# Altium footprint library Mylib.PcbLib: 294 footprints (part 3 of 19)
Each footprint in its own frame and in the unit in brackets; x right, y up, seen from the top. Pads: shape width x height; smd on the part's side, far side on the other; paste and mask are expansions set on the pad; w line width, h text height; cw(c..) or ccw(c..) is an arc to the next point about the centre after c.
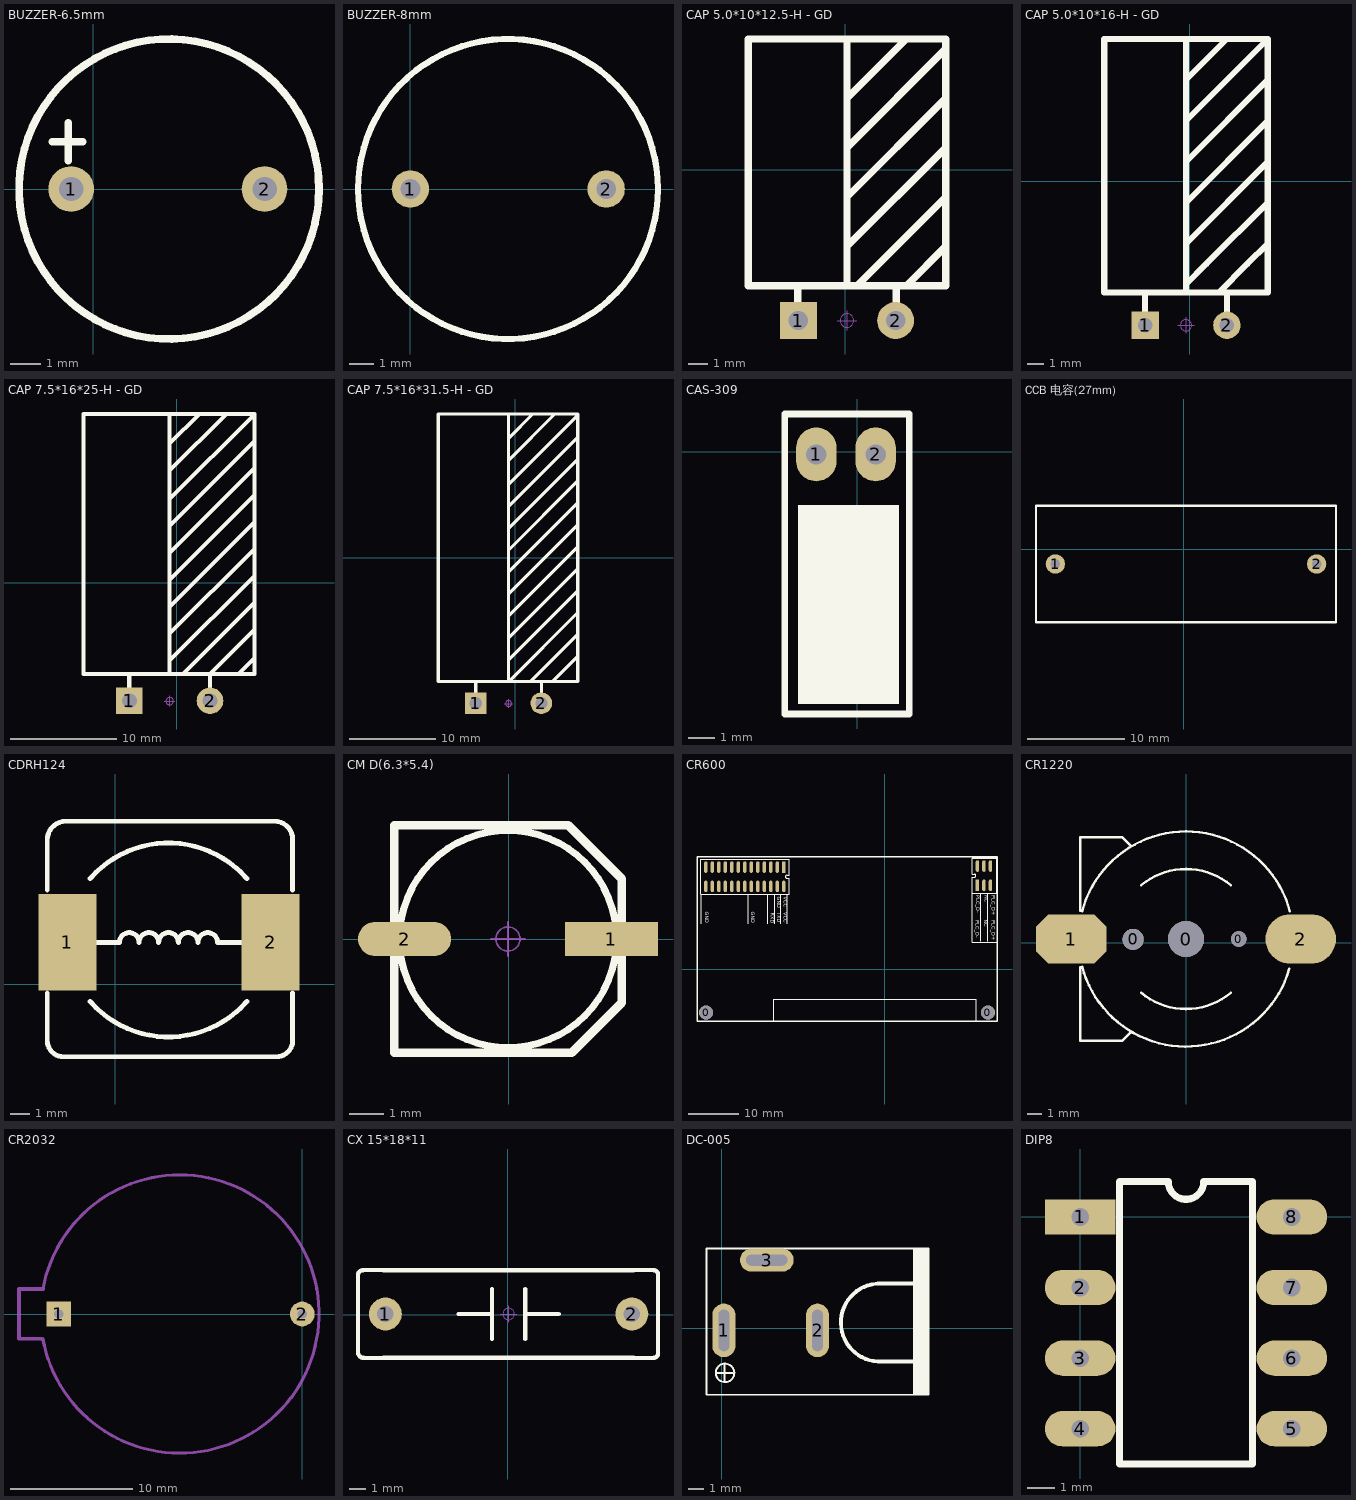
[diagram p2: the footprints below, top view; thin cyan lines are the x and y axes]

## BUZZER-6.5mm [mil]
pads (2):
  round 60 hole 32 mask+0: 1(-29,0) 2(224.85,0)
Top Overlay:
  circle w10: c99.43,0 r196.85
  lines w10: -54,62 -14,62 ; -33,37 -33,87
3D body "蜂?": height 354.33, standoff -78.74, extent -140.21,-236.21 332.23,236.23

## BUZZER-8mm [mil]
pads (2):
  round 60 hole 32 mask+0: 1(0,0) 2(314.96,0)
Top Overlay:
  circle w10: c157,0 r241.2
3D body: height 379.92, standoff -177.17, extent -81.05,-238.44 527.05,234

## CAP 5.0*10*12.5-H - GD [mm] "脚距5mm直径10mm高度12.5mm"
pads (2):
  rect 1.9x1.9 hole 1: 1(-2.398,-7.747)
  round 1.9 hole 1: 2(2.602,-7.747)
Top Overlay:
  lines w0.381: -2.438,-6.985 -2.438,-5.969 ; 0.102,-5.969 0.102,6.663 ; 0.102,-3.937 5.182,1.143 ; 0.102,-1.397 5.182,3.683 ; 0.102,1.143 5.182,6.223 ; 0.102,3.683 3.15,6.731 ; 0.61,-5.969 5.182,-1.397 ; 2.642,-6.985 2.642,-5.969 ; 3.15,-5.969 5.182,-3.937 ; -4.978,-5.969 -4.978,6.731 5.182,6.731 5.182,-5.969 -4.978,-5.969
Mechanical 15:
  circle w0.05: c0.102,-7.747 r0.35
  lines w0.05: -0.398,-7.747 0.602,-7.747 ; 0.102,-8.247 0.102,-7.247
3D body "CAP 5X10X12.5-H.STEP": height 10.03, standoff -3.48, extent -4.898,-8.047 5.112,6.663

## CAP 5.0*10*16-H - GD [mm] "脚距5mm直径10mm高度16mm"
pads (2):
  rect 1.7x1.7 hole 0.9: 1(-2.78,-8.961)
  round 1.7 hole 0.9: 2(2.3,-8.961)
Top Overlay:
  lines w0.381: -2.78,-8.199 -2.78,-7.183 -2.78,-6.929 ; -0.24,-6.929 -0.24,-6.421 ; -0.24,-5.151 -0.24,8.819 ; -0.24,-4.897 -0.24,-6.421 ; -0.24,-3.881 4.84,1.199 ; -0.24,-1.341 4.84,3.739 ; -0.24,1.199 4.84,6.279 ; -0.24,3.739 4.84,8.819 ; -0.24,6.279 2.3,8.819 ; 1.792,-6.929 3.57,-5.151 4.84,-3.881 ; 2.3,-8.199 2.3,-7.183 2.3,-6.929 ; 4.84,-1.341 1.03,-5.151 -0.24,-6.421 ; 4.84,8.819 4.84,-6.929 -5.32,-6.929 -5.32,8.819 4.84,8.819
Mechanical 15:
  circle w0.05: c-0.24,-8.961 r0.35
  lines w0.05: -0.74,-8.961 0.26,-8.961 ; -0.24,-9.461 -0.24,-8.461
3D body "CAP 5X10X16-H.STEP": height 10.03, standoff -3.48, extent -5.28,-9.261 4.73,8.949

## CAP 7.5*16*25-H - GD [mm] "脚距7.5mm直径16mm高度25mm"
pads (2):
  rect 2.5x2.5 hole 1.4: 1(-4.486,-11.138)
  round 2.5 hole 1.4: 2(3.114,-11.138)
Top Overlay:
  lines w0.381: -4.496,-9.906 -4.496,-8.636 ; -0.686,-8.636 -0.686,15.875 ; -0.686,-7.366 7.315,0.635 ; -0.686,-4.826 7.315,3.175 ; -0.686,-2.286 7.315,5.715 ; -0.686,0.254 7.315,8.255 ; -0.686,2.794 7.252,10.731 ; -0.686,5.334 7.252,13.271 ; -0.686,7.874 7.243,15.803 ; -0.686,10.541 4.648,15.875 ; -0.686,13.081 2.108,15.875 ; 0.584,-8.636 7.315,-1.905 ; 3.124,-9.906 3.124,-8.636 7.315,-4.445 ; 5.791,-8.636 7.315,-7.112 ; -8.814,-8.636 7.315,-8.636 7.315,15.875 -8.814,15.875 -8.814,-8.636
Mechanical 15:
  circle w0.05: c-0.686,-11.176 r0.35
  lines w0.05: -1.186,-11.176 -0.186,-11.176 ; -0.686,-11.676 -0.686,-10.676
3D body "CAP 7.5X16X25-H.STEP": height 16.03, standoff -3.48, extent -8.736,-11.638 7.274,15.772

## CAP 7.5*16*31.5-H - GD [mm] "脚距7.5mm直径16mm高度31.5mm"
pads (2):
  rect 2.5x2.5 hole 1.4: 1(-4.593,-16.864)
  round 2.5 hole 1.4: 2(3.007,-16.864)
Top Overlay:
  lines w0.381: -4.603,-15.632 -4.603,-14.362 ; -0.793,-11.822 7.208,-3.821 ; -0.793,-9.282 7.145,-1.344 ; -0.793,-6.742 7.145,1.196 ; -0.793,-4.202 7.145,3.736 ; -0.793,-1.662 7.145,6.276 ; -0.793,0.878 7.145,8.816 ; -0.793,3.418 7.145,11.356 ; -0.793,5.958 7.145,13.896 ; -0.793,8.498 7.137,16.427 ; -0.793,11.292 4.541,16.626 ; -0.793,13.832 2.001,16.626 ; -0.793,16.626 -0.793,-14.362 7.208,-6.361 ; 1.747,-14.362 7.208,-8.901 ; 3.017,-15.632 3.017,-14.362 ; 4.287,-14.362 7.208,-11.441 ; -8.921,-14.362 -8.921,16.626 7.208,16.626 7.208,-14.362 -8.921,-14.362
Mechanical 15:
  circle w0.05: c-0.793,-16.902 r0.35
  lines w0.05: -1.293,-16.902 -0.293,-16.902 ; -0.793,-17.402 -0.793,-16.402
3D body "CAP 7.5X16X31.5-H.STEP": height 16.03, standoff -3.48, extent -8.843,-17.364 7.167,16.546

## CAS-309 [mil]
pads (2):
  oval 60x80 hole 30: 1(-61,-4) 2(27,-4)
Top Overlay:
  rectangle: -88,-374 62,-79
  lines w10: -108,-389 77,-389 77,56 -108,56 -108,-389
3D body: height 365.16, standoff -59.06, extent -81.91,-72 53.91,53.94

## CCB 电容(27mm) [mm]
pads (2):
  round 2 hole 1: 1(-13.291,-1.524) 2(13.709,-1.524)
Top Overlay:
  lines w0.254: -15.291,-7.524 15.709,-7.524 15.709,4.476 -15.291,4.476 -15.291,-7.524
3D body "User Library-CBB81_W31_0_H20_5_T12_0_P27_0.STEP": height 23.5, standoff -10, extent -15.291,-7.524 15.706,4.476

## CDRH124 [mm]
pads (2):
  rect 3x5 smd: 1(-2.469,2.159) 2(8.057,2.159)
Top Overlay:
  lines w0.254: -3.505,-0.457 -3.505,-2.921 ccw(c-2.667,-2.921) -2.667,-3.759 -2.235,-3.759 7.925,-3.759 8.357,-3.759 ccw(c8.357,-2.921) 9.195,-2.921 9.195,-0.457 ; -3.505,4.877 -3.505,7.468 cw(c-2.54,7.468) -2.54,8.433 -2.235,8.433 7.925,8.433 8.255,8.433 cw(c8.255,7.493) 9.195,7.493 9.195,4.877 ; -1.295,-0.889 ccw(c2.769,2.667) 6.833,-0.889 ; -1.295,5.461 cw(c2.769,1.905) 6.833,5.461 ; -1.041,2.159 0.229,2.159 cw(c0.737,2.159) 1.245,2.159 cw(c1.753,2.159) 2.261,2.159 cw(c2.769,2.159) 3.277,2.159 cw(c3.785,2.159) 4.293,2.159 cw(c4.801,2.159) 5.309,2.159 6.579,2.159
3D body "CDRH124.STEP": height 4.55, standoff 0.05, extent -3.11,-3.77 8.89,8.23

## CM D(6.3*5.4) [mm] "贴片电解电容，直径6.3mm，高5.4mm"
pads (2):
  rect 2.7x1 smd: 1(2.975,0)
  oval 2.7x1 smd: 2(-3.025,0)
Top Overlay:
  circle w0.2: c-0.025,0 r3.15
  lines w0.254: -3.325,-3.3 -3.325,3.3 1.725,3.3 3.275,1.75 3.275,-1.85 1.825,-3.3 -3.325,-3.3
Mechanical 15:
  circle w0.05: c-0.025,0 r0.35
  lines w0.05: -0.525,0 0.475,0 ; -0.025,-0.5 -0.025,0.5
3D body "CM D(6.3X5.4).STEP": height 5.4, standoff -0.01, extent -3.525,-3.3 3.475,3.3

## CR600 [mm]
pads (34):
  round 2.8 hole 2.7: 0(-35.7,-8.7) 0(20.7,-8.7)
  rect 0.7x2.3 smd: 1(-20.14,20.374) 31(18.594,16.739)
  oval 0.7x2.3 smd: 2(-20.14,16.524) 3(-21.44,20.374) 4(-21.44,16.524) 5(-22.74,20.374) 6(-22.74,16.524) 7(-24.04,20.374) 8(-24.04,16.524) 9(-25.34,20.374) 10(-25.34,16.524) 11(-26.64,20.374) 12(-26.64,16.524) 13(-27.94,20.374) 14(-27.94,16.524) 15(-29.24,20.374) 16(-29.24,16.524) 17(-30.54,20.374) 18(-30.54,16.524) 19(-31.84,20.374) 20(-31.84,16.524) 21(-33.14,20.374) 22(-33.14,16.524) 23(-34.44,20.374) 24(-34.44,16.524) 25(-35.74,20.374) 26(-35.74,16.524) 32(18.594,20.589) 33(19.894,16.739) 34(19.894,20.589) 35(21.194,16.739) 36(21.194,20.589)
Top Overlay:
  lines w0.127: -36.7,9.1 -36.7,14.9 ; -27.3,9.1 -27.3,14.9 ; -23.4,9.1 -23.4,14.9 ; -22.2,-10.5 -22.2,-6 18.4,-6 18.4,-10.5 ; -22,9.1 -22,14.9 ; -20.8,9.1 -20.8,14.9 ; -19.5,9.1 -19.5,14.9 ; 17.5,15.113 17.5,5.4 22.5,5.4 ; 19.3,5.51 19.3,15.1 ; 20.7,5.51 20.7,15.1
  lines w0.2: 17.5,15.113 17.5,18.339 17.944,18.339 ccw(c17.944,18.664) 17.944,18.989 17.553,18.989 17.553,22.2 ; -36.726,14.913 -36.726,22 -19.099,22 -19.099,18.774 -19.49,18.774 ccw(c-19.49,18.449) -19.49,18.124 -19.099,18.124 -19.099,14.913 -36.726,14.913
  lines w0.203: 17.5,15.113 22.455,15.113
  lines w0.254: 17.553,22.2 22.379,22.2 ; 22.43,15.139 22.455,15.113 22.455,22.124 ; -37.5,-10.5 22.5,-10.5 22.5,22.5 -37.5,22.5 -37.5,-10.5
  text "NC" at 19.6,9.804 h1.27
  text "PLC_D-" at 18,9.8 h1.27
  text "PLC_D+" at 21.1,9.8 h1.27
  text "GND" at -36.2,11.5 h1.27
  text "GND" at -27,11.5 h1.27
  text "RXD" at -23.1,11.3 h1.27
  text "GND" at -21.8,14.404 h1.27
  text "TXD" at -21.8,11.304 h1.27
  text "VCC" at -20.5,11.304 h1.27
  text "VCC" at -20.5,14.404 h1.27
  text "PLC_D+" at 21.1,14.7 h1.27
  text "PLC_D-" at 18.1,14.7 h1.27
  text "NC" at 19.7,14.704 h1.27

## CR1220 [mm]
pads (5):
  round 1.5 hole 1.5: 0(-3.75,0.229)
  round 2.54 hole 2.54: 0(0,0.254)
  round 1.1 hole 1.1: 0(3.75,0.254)
  oct 5x3.5 smd: 1(-8.128,0.254)
  oval 5x3.5 smd: 2(8.128,0.254)
Top Overlay:
  lines w0.178: -7.5,-1.746 -7.5,-6.946 -4.5,-6.946 -3.925,-6.371 ; -7.5,2.254 -7.5,7.454 -4.5,7.454 -3.9,6.854 ; -7.363,-1.709 ccw(c0,0.254) 7.327,-1.839 ; -7.363,2.217 cw(c0,0.254) 0,7.874 cw(c0,0.254) 7.363,2.217 ; -3.175,-3.556 ccw(c0,0.254) 3.172,-3.558 ; -3.169,4.069 cw(c0,0.254) 3.172,4.066
3D body "CR1220.STEP": height 4.19, standoff -0.75, extent -9.377,-7.377 9.123,7.62

## CR2032 [mil]
pads (2):
  rect 80x80 hole 30: 1(-787.4,0)
  round 80 hole 30: 2(0,0)
Mechanical 1:
  lines w10: -838.99,-79.11 ccw(c-396,0) -838.73,80.57
  lines w12: -838.73,80.57 -916,80.57 -916,-80 -844,-80 -837.74,-85.84
3D body: height 78.74, standoff 0, extent -788.27,-390.59 -1.3,396.6

## CX 15*18*11 [mm] "安规电容"
pads (2):
  round 2 hole 1: 1(-7.449,0.051) 2(7.551,0.051)
Top Overlay:
  lines w0.25: -9.119,-2.28 -9.119,2.413 ; -8.814,2.718 -7.569,2.718 ; -8.782,-2.616 -7.569,-2.616 ; 7.671,-2.616 8.884,-2.616 ; 7.671,2.718 8.884,2.718 ; 9.144,-2.356 9.144,2.458
  lines w0.254: -9.119,-2.28 ccw(c-8.782,-2.28) -8.782,-2.616 ; -9.119,2.413 cw(c-8.814,2.413) -8.814,2.718 ; -7.569,-2.616 7.671,-2.616 ; -7.569,2.718 7.671,2.718 ; -2.997,0.051 -0.965,0.051 ; -0.965,-1.473 -0.965,1.575 ; 1.067,-1.473 1.067,1.575 ; 1.067,0.051 3.099,0.051 ; 8.884,-2.616 ccw(c8.884,-2.356) 9.144,-2.356 ; 8.884,2.718 cw(c8.884,2.458) 9.144,2.458
Mechanical 15:
  circle w0.05: c0.051,0.051 r0.35
  lines w0.05: -0.449,0.051 0.551,0.051 ; 0.051,-0.449 0.051,0.551
3D body "x2v-18w11h5t-p15.stp": height 11.01, standoff -3.99, extent -8.966,-2.464 9.034,2.541

## DC-005 [mm]
pads (3):
  oval 1.5x3.5 hole 0.7 slot 2.7 at 90 deg: 1(0.127,-0.127) 2(6.223,-0.127)
  oval 3.5x1.5 hole 0.7 slot 2.7 at 0 deg: 3(2.921,4.445)
Top Overlay:
  circle w0.127: c0.203,-2.896 r0.604
  region: 13.462,-4.318 13.462,5.207 12.446,5.207 12.446,-4.318
  region: 13.462,-4.318 13.462,5.207 12.827,5.207 12.827,-4.318
  lines w0.127: -0.33,-2.896 0.686,-2.896 ; 0.178,-3.404 0.178,-2.388 ; -1.016,-4.318 -1.016,-1.524 -1.016,5.207 13.462,5.207 13.462,-4.318 -1.016,-4.318
  lines w0.254: 10.16,-2.159 13.183,-2.159 ; 10.16,2.921 13.208,2.921 ; 10.287,2.924 ccw(c10.287,0.381) 10.414,-2.159
3D body "SW3dPS-rapc722.STEP": height 10.92, standoff -3.56, extent -0.923,-4.267 13.674,5.258

## DIP8 [mm]
pads (8):
  rect 2.54x1.27 hole 0.635: 1(0,0)
  oval 2.54x1.27 hole 0.635: 2(0,-2.54) 3(0,-5.08) 4(0,-7.62) 5(7.62,-7.62) 6(7.62,-5.08) 7(7.62,-2.54) 8(7.62,0)
Top Overlay:
  lines w0.254: 1.422,-8.89 6.198,-8.89 6.198,1.27 4.445,1.27 cw(c3.81,1.27) 3.175,1.27 1.422,1.27 1.422,-8.89
3D body "DIP-8.STEP": height 3.8, standoff -4.58, extent 0.003,-8.765 7.823,1.145